# Altium footprint library neoxin.PcbLib: 61 footprints (part 4 of 4)
Each footprint in its own frame and in the unit in brackets; x right, y up, seen from the top. Pads: shape width x height; smd on the part's side, far side on the other; paste and mask are expansions set on the pad; w line width, h text height; cw(c..) or ccw(c..) is an arc to the next point about the centre after c.
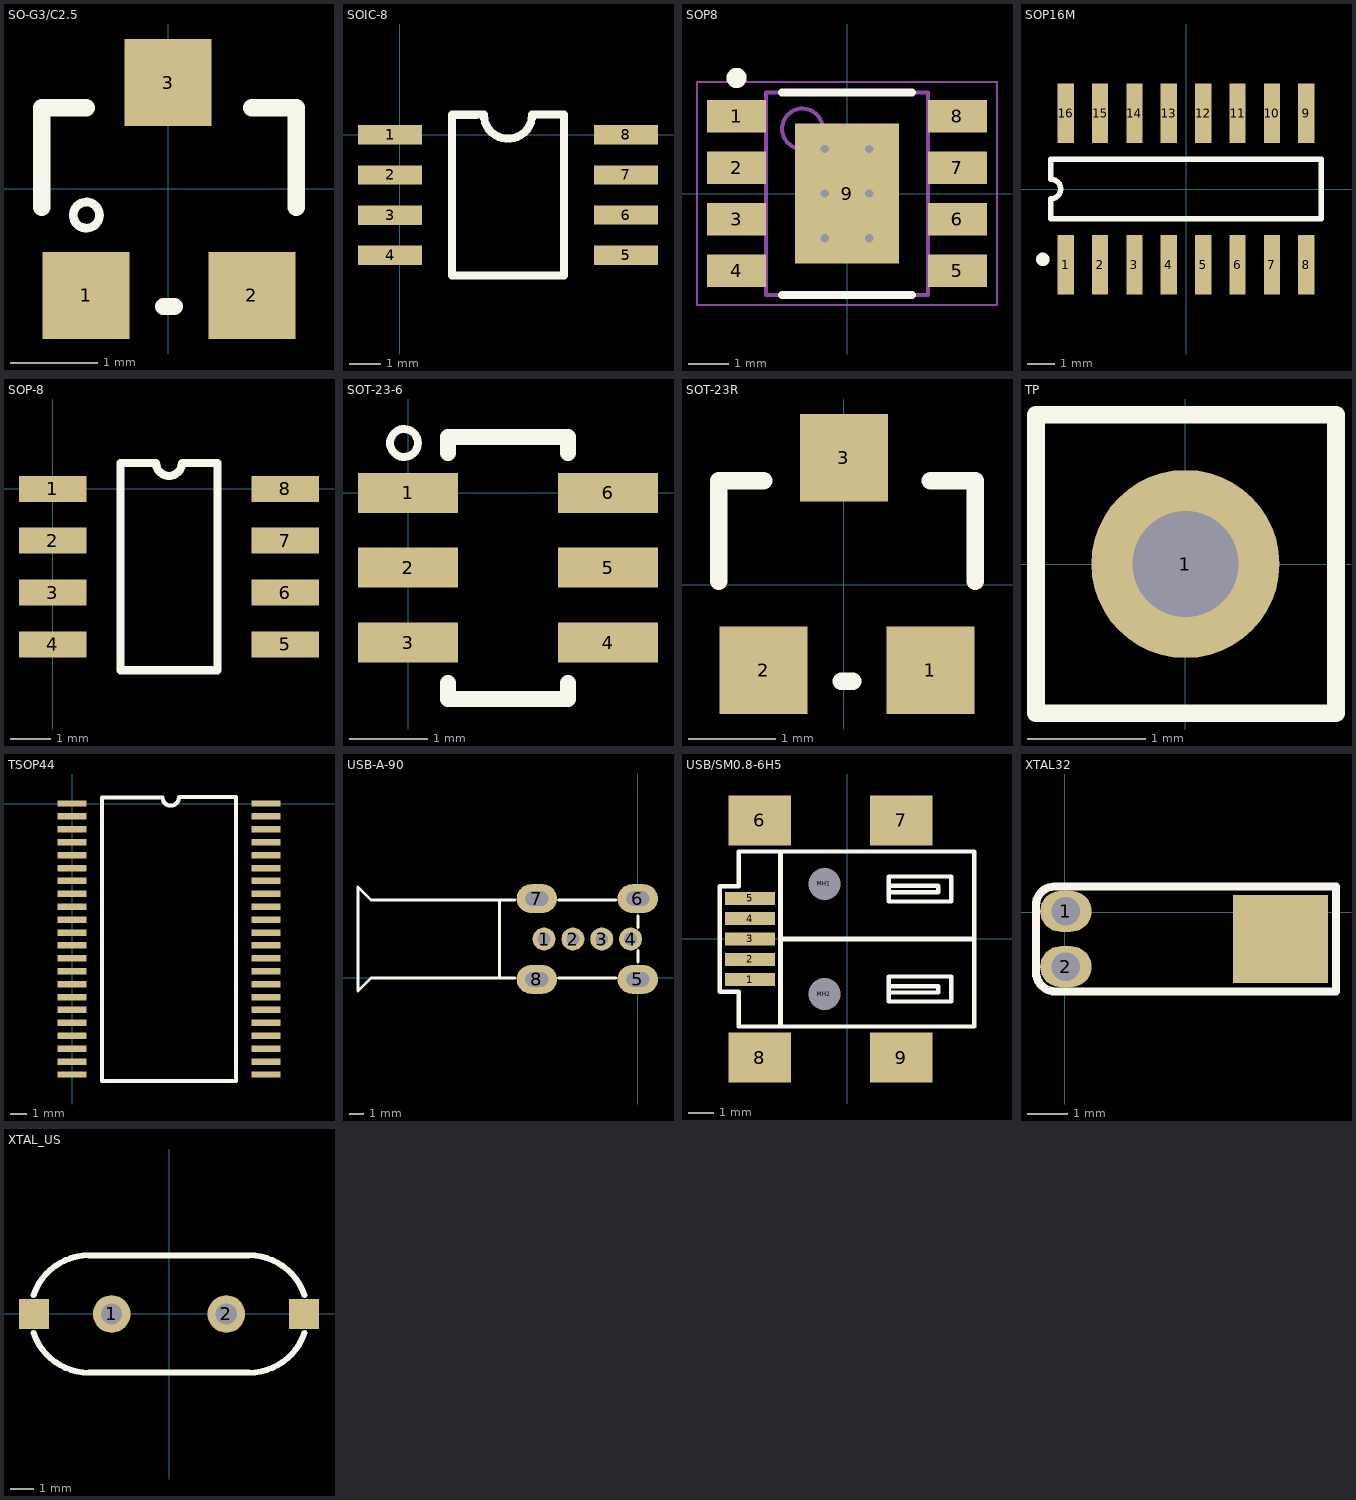
[diagram p3: the footprints below, top view; thin cyan lines are the x and y axes]

## SO-G3/C2.5 [mm]
pads (3):
  rect 1x1 smd: 1(-0.943,-1.229) 2(0.962,-1.229) 3(0,1.219)
Top Overlay:
  circle w0.1: c-0.94,-0.305 r0.15
  lines w0.2: -1.451,-0.213 -1.451,0.93 -0.943,0.93 ; -0.054,-1.356 0.073,-1.356 ; 0.962,0.93 1.47,0.93 1.47,-0.213
3D body "sot23-3.STEP": height 1, standoff -0.02, extent -1.46,-1.194 1.46,1.282

## SOIC-8 [mil]
pads (8):
  rect 80x24 smd: 1(-11.81,0) 2(-11.81,-50.06) 3(-11.81,-100.06) 4(-11.81,-150.06) 5(281.81,-150) 6(281.81,-100) 7(281.81,-50) 8(281.81,0)
Top Overlay:
  lines w10: 75,24.94 75.06,25 105,25 ccw(c135,25) 165,25 204.94,25 205,24.94 205,-175.06 65,-175.06 65,24.94 95,24.94
3D body "SOIC8.STEP": height 90.55, standoff -0.78, extent -31.2,-181.9 299.21,29.91

## SOP8 [mm] "SOP, 8-Leads, Body 5.00x4.00mm, Pitch 1.27mm, Thermal Pad 3.45x2.56mm, IPC Medium Density"
height 1.7
pads (9):
  rect 1.45x0.8 smd: 1(-2.725,1.905) 2(-2.725,0.635) 3(-2.725,-0.635) 4(-2.725,-1.905) 5(2.725,-1.905) 6(2.725,-0.635) 7(2.725,0.635) 8(2.725,1.905)
  rect 2.56x3.45 smd: 9(0,0)
via -0.55,1.1 diameter 0.5 hole 0.2
via 0.55,1.1 diameter 0.5 hole 0.2
via -0.55,0 diameter 0.5 hole 0.2
via 0.55,0 diameter 0.5 hole 0.2
via -0.55,-1.1 diameter 0.5 hole 0.2
via 0.55,-1.1 diameter 0.5 hole 0.2
Top Overlay:
  circle w0.25: c-2.725,2.855 r0.125
  lines w0.2: -1.6,-2.5 1.6,-2.5 ; -1.6,2.5 1.6,2.5
Mechanical 13:
  circle w0.1: c-1.1,1.6 r0.5
  lines w0.1: -2,-2.5 -2,2.5 2,2.5 2,-2.5 -2,-2.5
Mechanical 15:
  lines w0.05: -3.7,-2.75 -3.7,2.75 3.7,2.75 3.7,-2.75 -3.7,-2.75
  lines w0.1: -0.5,0 0.5,0 ; 0,-0.5 0,0.5
3D body: height 1.7, standoff 0.25, extent -2,-2.5 2,2.5

## SOP16M [mm]
pads (16):
  rect 0.6x2.2 smd: 1(-4.445,-2.8) 2(-3.175,-2.8) 3(-1.905,-2.8) 4(-0.635,-2.8) 5(0.635,-2.8) 6(1.905,-2.8) 7(3.175,-2.8) 8(4.445,-2.8) 9(4.445,2.8) 10(3.175,2.8) 11(1.905,2.8) 12(0.635,2.8) 13(-0.635,2.8) 14(-1.905,2.8) 15(-3.175,2.8) 16(-4.445,2.8)
Top Overlay:
  circle w0.25: c-5.295,-2.6 r0.125
  lines w0.2: -5,-1.1 -5,-0.367 ccw(c-5,0) -5,0.367 -5,1.1 5,1.1 5,-1.1 -5,-1.1
3D body "SO-16.step": height 1.45, standoff 0, extent -5.004,-2.927 4.978,2.978

## SOP-8 [mil]
pads (8):
  rect 65x25 smd: 1(0,0) 2(0,-50) 3(0,-100) 4(0,-150) 5(224.41,-150) 6(224.41,-100) 7(224.41,-50) 8(224.41,0)
Top Overlay:
  lines w7.87: 65.37,-175 159.04,-175 159.04,25 124.7,25 cw(c112.2,25) 99.7,25 65.37,25 65.37,-175
3D body "SOP8.STEP": height 62.99, standoff 0, extent -7.7,-172.62 230.17,25.02

## SOT-23-6 [mil]
pads (6):
  rect 50x20 smd: 1(0,0) 2(0,-37.4) 3(0,-74.8) 4(100,-74.8) 5(100,-37.4) 6(100,0)
Top Overlay:
  circle w3.94: c-2,24.97 r6.97
  lines w8: 20,-95 20,-103 80,-103 80,-95 ; 20,20 20,28 80,28 80,20
3D body "User Library-SOT-23-6.STEP": height 42.61, standoff -0.39, extent -0.5,-93 95,17

## SOT-23R [mm]
pads (3):
  rect 1x1 smd: 1(0.988,-0.975) 2(-0.917,-0.975) 3(0,1.448)
Top Overlay:
  lines w0.2: -1.425,0.041 -1.425,1.184 -0.917,1.184 ; -0.028,-1.102 0.099,-1.102 ; 0.988,1.184 1.496,1.184 1.496,0.041
3D body "SOT-23-3.STEP": height 1.2, standoff 0, extent -1.425,-1.146 1.475,1.654

## TP [mm]
pads (1):
  round 1.6 hole 0.9: 1(0,0)
Top Overlay:
  lines w0.15: 1.26,-1.27 -1.27,-1.27 -1.27,1.27 1.27,1.27 ; 1.28,-1.27 1.28,1.27

## TSOP44 [mm]
pads (44):
  rect 1.8x0.4 smd: 1(-0.009,0.001) 2(-0.009,-0.799) 3(-0.009,-1.599) 4(-0.009,-2.399) 5(-0.009,-3.199) 6(-0.009,-3.999) 7(-0.009,-4.799) 8(-0.009,-5.599) 9(-0.009,-6.399) 10(-0.009,-7.199) 11(-0.009,-7.999) 12(-0.009,-8.799) 13(-0.009,-9.599) 14(-0.009,-10.399) 15(-0.009,-11.199) 16(-0.009,-11.999) 17(-0.009,-12.799) 18(-0.009,-13.599) 19(-0.009,-14.399) 20(-0.009,-15.199) 21(-0.009,-15.999) 22(-0.009,-16.799) 23(11.991,-16.799) 24(11.991,-15.999) 25(11.991,-15.199) 26(11.991,-14.399) 27(11.991,-13.599) 28(11.991,-12.799) 29(11.991,-11.999) 30(11.991,-11.199) 31(11.991,-10.399) 32(11.991,-9.599) 33(11.991,-8.799) 34(11.991,-7.999) 35(11.991,-7.199) 36(11.991,-6.399) 37(11.991,-5.599) 38(11.991,-4.799) 39(11.991,-3.999) 40(11.991,-3.199) 41(11.991,-2.399) 42(11.991,-1.599) 43(11.991,-0.799) 44(11.991,0.001)
Top Overlay:
  lines w0.2: 1.826,-17.199 10.156,-17.199
  lines w0.254: 6.604,0.381 cw(c6.096,0.381) 5.588,0.381 1.846,0.381 1.846,-17.18 1.826,-17.199 10.156,-17.199 ; 6.624,0.401 10.156,0.401 10.156,-17.199 ; 10.156,-17.199 10.156,-17.199
3D body "TSOP44.STEP": height 1.23, standoff -0.09, extent 0.089,-17.526 11.849,0.684

## USB-A-90 [mm]
pads (8):
  round 1.6 hole 0.9: 1(-6.5,2.7) 2(-4.5,2.7) 3(-2.5,2.7) 4(-0.5,2.7)
  oval 2.8x2 hole 1 slot 1.6 at 0 deg: 5(0,-0.1) 6(0,5.5) 7(-7,5.5) 8(-7,-0.1)
Top Overlay:
  lines w0.203: -18.75,5.65 -18.5,5.4 ; -17.2,0 -8.5,0 ; -16.8,0 -18.5,0 -19.4,-0.9 -19.4,6.3 -18.5,5.4 ; -15.6,5.4 -18.5,5.4 ; -9.6,0 -9.6,5.4 ; -8.5,5.4 -18.5,5.4 ; -5.5,0 -1.5,0 ; -5.5,5.4 -1.5,5.4 ; 0,1.1 0,1.9 ; 0,3.5 0,4.3
3D body "User Library-USB-STRT-CONN.step": height 14.6, standoff -0.87, extent -18.821,-0.8 0.529,6.2

## USB/SM0.8-6H5 [mm]
pads (11):
  rect 2x0.52 smd: 1(-3.886,-1.626) 2(-3.886,-0.813) 3(-3.886,0) 4(-3.886,0.813) 5(-3.886,1.626)
  rect 2.5x2 smd: 6(-3.505,4.75) 7(2.151,4.746) 8(-3.505,-4.75) 9(2.151,-4.746)
  round 0.6 hole 1.27 unplated: MH1(-0.914,2.2) MH2(-0.914,-2.2)
Top Overlay:
  lines w0.178: 1.651,-2.139 3.636,-2.139 3.636,-1.936 3.636,-1.885 1.651,-1.885 ; 1.651,1.874 3.636,1.874 3.636,2.128 1.651,2.128 ; -5.105,-2.108 -5.105,0.942 -5.105,2.108 -4.349,2.108 -4.349,3.5 5.08,3.5 5.08,-3.5 -4.349,-3.5 -4.349,-2.636 -4.349,-2.108 -5.105,-2.108 ; 1.651,-2.5 4.151,-2.5 4.151,-1.5 1.651,-1.5 1.651,-2.5 ; 1.651,1.5 4.151,1.5 4.151,2.5 1.651,2.5 1.651,1.5
  lines w0.2: -2.67,-3.464 -2.67,3.486 ; -2.67,0 5.055,0
3D body "miniUSB-DIP.STEP": height 3.95, standoff -1, extent -4.295,-5.315 4.905,5.385

## XTAL32 [mil]
pads (3):
  oval 50x40 hole 28: 1(1,1) 2(1,-53)
  rect 92.13x86 smd: ""(210,-26)
Top Overlay:
  lines w8: -28,-58.59 ccw(c-9.25,-58.25) -8.91,-77 ; -28,-58.25 -28,7.07 ; -28,6.76 cw(c-10.07,7.07) -10.39,25 ; -10.07,25 264,25 264,-77 -9.25,-77
3D body: height 78.66, standoff 0.08, extent 19.89,-65 256.11,13.43

## XTAL_US [mm]
pads (4):
  round 1.6 hole 0.9: 1(-2.44,0) 2(2.44,0)
  rect 1.27x1.27 smd: ""(-5.75,0) ""(5.75,0)
Top Overlay:
  lines w0.254: -5.766,-0.809 ccw(c-3.4,0) -3.4,-2.5 ; -5.766,0.809 cw(c-3.4,0) -3.4,2.5 3.4,2.5 cw(c3.4,0) 5.765,0.809 ; -3.405,-2.5 3.4,-2.5 ccw(c3.4,0) 5.765,-0.809
3D body "hc-49s_y.stp": height 3.5, standoff -3, extent -5.39,-2.255 5.41,2.245